# Altium integrated library Samtec PC104 Plus.IntLib: 120 symbols (part 2 of 2)
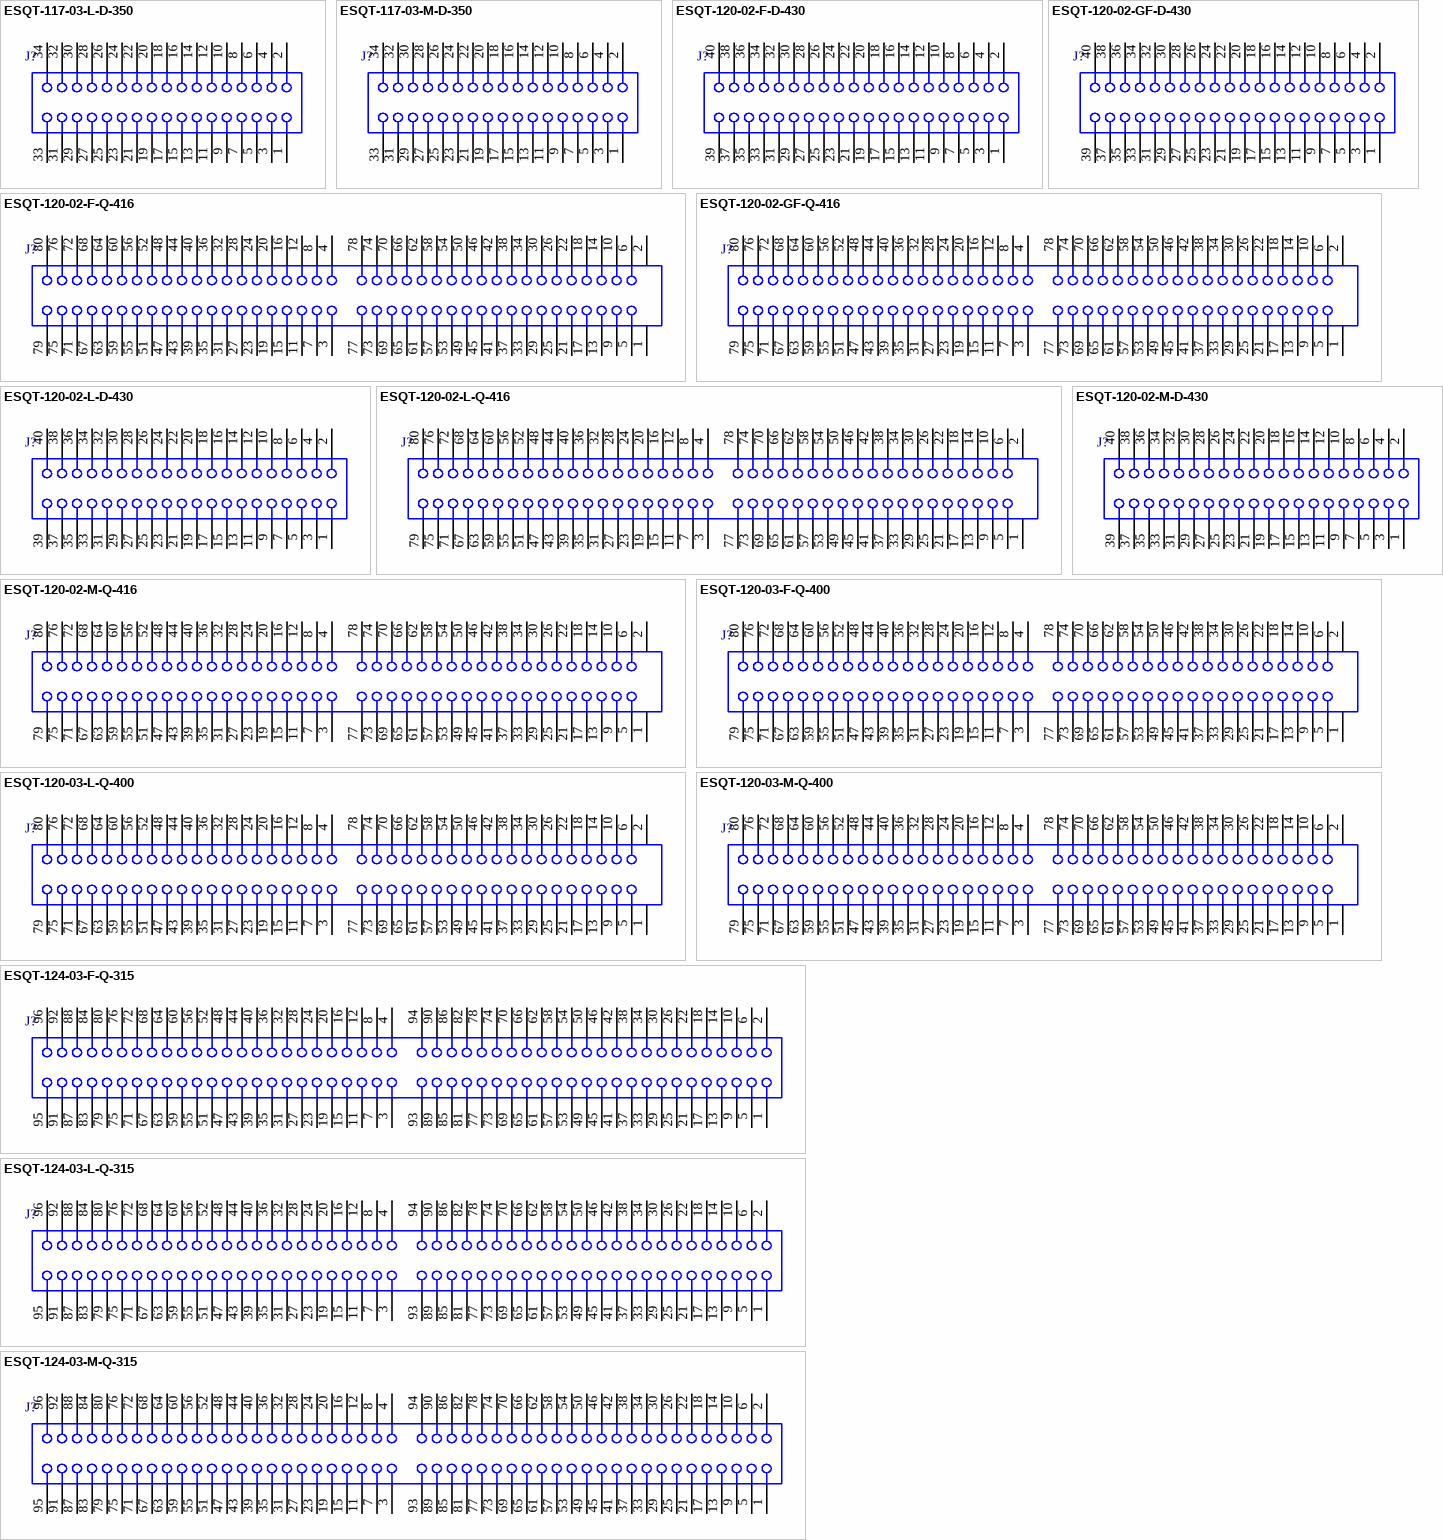
[diagram p5: symbols ESQT-117-03-L-D-350 to ESQT-124-03-M-Q-315]

## ESQT-120-03-F-Q-400
designator J?
PC/104-Plus(TM) Flexible Elevated Socket Strips, Through-hole, Vertical, -55 to 125 degC, 2 mm Pitch, 80-Pin, Female, RoHS; Manufacturer: Samtec; PartNumber: ESQT-120-03-F-Q-400; Pitch: 2 mm; DatasheetVersion: F-214; PackageVersion: BK, 10/1995; PackageReference: ESQT-120-03-X-Q-400; PackageDescription: Elevated SQT ASSM; Orientation: Vertical; RoHS: True; Temperature Range: -55 to 125 degC; Mounting Technology: Through-hole; ComponentLink1Description: Manufacturer URL; ComponentLink1URL: http://www.samtec.com; ComponentLink2Description: Datasheet; ComponentLink2URL: http://www.samtec.com/documents/webfiles/pdf/ESQT_TH.PDF; ComponentLink3Description: Package Specification; ComponentLink3URL: http://www.samtec.com/documents/webfiles/cpdf/ESQT-1XX-XX-XX-X-XXX-XXX-XX-MKT.pdf
footprint SMTC-ESQT-120-03-X-Q-400 (Flexible Elevated Socket, 4x20 Pins, Vertical, 2mm Pitch, Female)
pins: 1, 2, 3, 4, 5, 6, 7, 8, 9, 10, 11, 12, 13, 14, 15, 16, 17, 18, 19, 20, 21, 22, 23, 24, 25, 26, 27, 28, 29, 30, 31, 32, 33, 34, 35, 36, 37, 38, 39, 40, 41, 42, 43, 44, 45, 46, 47, 48, 49, 50, 51, 52, 53, 54, 55, 56, 57, 58, 59, 60, 61, 62, 63, 64, 65, 66, 67, 68, 69, 70, 71, 72, 73, 74, 75, 76, 77, 78, 79, 80

## ESQT-120-03-L-Q-400
designator J?
PC/104-Plus(TM) Flexible Elevated Socket Strips, Through-hole, Vertical, -55 to 125 degC, 2 mm Pitch, 80-Pin, Female, RoHS; Manufacturer: Samtec; PartNumber: ESQT-120-03-L-Q-400; Pitch: 2 mm; DatasheetVersion: F-214; PackageVersion: BK, 10/1995; PackageReference: ESQT-120-03-X-Q-400; PackageDescription: Elevated SQT ASSM; Orientation: Vertical; RoHS: True; Temperature Range: -55 to 125 degC; Mounting Technology: Through-hole; ComponentLink1Description: Manufacturer URL; ComponentLink1URL: http://www.samtec.com; ComponentLink2Description: Datasheet; ComponentLink2URL: http://www.samtec.com/documents/webfiles/pdf/ESQT_TH.PDF; ComponentLink3Description: Package Specification; ComponentLink3URL: http://www.samtec.com/documents/webfiles/cpdf/ESQT-1XX-XX-XX-X-XXX-XXX-XX-MKT.pdf
footprint SMTC-ESQT-120-03-X-Q-400 (Flexible Elevated Socket, 4x20 Pins, Vertical, 2mm Pitch, Female)
pins: 1, 2, 3, 4, 5, 6, 7, 8, 9, 10, 11, 12, 13, 14, 15, 16, 17, 18, 19, 20, 21, 22, 23, 24, 25, 26, 27, 28, 29, 30, 31, 32, 33, 34, 35, 36, 37, 38, 39, 40, 41, 42, 43, 44, 45, 46, 47, 48, 49, 50, 51, 52, 53, 54, 55, 56, 57, 58, 59, 60, 61, 62, 63, 64, 65, 66, 67, 68, 69, 70, 71, 72, 73, 74, 75, 76, 77, 78, 79, 80

## ESQT-120-03-M-Q-400
designator J?
PC/104-Plus(TM) Flexible Elevated Socket Strips, Through-hole, Vertical, -55 to 125 degC, 2 mm Pitch, 80-Pin, Female, RoHS; Manufacturer: Samtec; PartNumber: ESQT-120-03-M-Q-400; Pitch: 2 mm; DatasheetVersion: F-214; PackageVersion: BK, 10/1995; PackageReference: ESQT-120-03-X-Q-400; PackageDescription: Elevated SQT ASSM; Orientation: Vertical; RoHS: True; Temperature Range: -55 to 125 degC; Mounting Technology: Through-hole; ComponentLink1Description: Manufacturer URL; ComponentLink1URL: http://www.samtec.com; ComponentLink2Description: Datasheet; ComponentLink2URL: http://www.samtec.com/documents/webfiles/pdf/ESQT_TH.PDF; ComponentLink3Description: Package Specification; ComponentLink3URL: http://www.samtec.com/documents/webfiles/cpdf/ESQT-1XX-XX-XX-X-XXX-XXX-XX-MKT.pdf
footprint SMTC-ESQT-120-03-X-Q-400 (Flexible Elevated Socket, 4x20 Pins, Vertical, 2mm Pitch, Female)
pins: 1, 2, 3, 4, 5, 6, 7, 8, 9, 10, 11, 12, 13, 14, 15, 16, 17, 18, 19, 20, 21, 22, 23, 24, 25, 26, 27, 28, 29, 30, 31, 32, 33, 34, 35, 36, 37, 38, 39, 40, 41, 42, 43, 44, 45, 46, 47, 48, 49, 50, 51, 52, 53, 54, 55, 56, 57, 58, 59, 60, 61, 62, 63, 64, 65, 66, 67, 68, 69, 70, 71, 72, 73, 74, 75, 76, 77, 78, 79, 80

## ESQT-124-03-F-Q-315
designator J?
PC/104-Plus(TM) Flexible Elevated Socket Strips, Through-hole, Vertical, -55 to 125 degC, 2 mm Pitch, 96-Pin, Female, RoHS; Manufacturer: Samtec; PartNumber: ESQT-124-03-F-Q-315; Pitch: 2 mm; DatasheetVersion: F-214; PackageVersion: BK, 10/1995; PackageReference: ESQT-124-03-X-Q-315; PackageDescription: Elevated SQT ASSM; Orientation: Vertical; RoHS: True; Temperature Range: -55 to 125 degC; Mounting Technology: Through-hole; ComponentLink1Description: Manufacturer URL; ComponentLink1URL: http://www.samtec.com; ComponentLink2Description: Datasheet; ComponentLink2URL: http://www.samtec.com/documents/webfiles/pdf/ESQT_TH.PDF; ComponentLink3Description: Package Specification; ComponentLink3URL: http://www.samtec.com/documents/webfiles/cpdf/ESQT-1XX-XX-XX-X-XXX-XXX-XX-MKT.pdf
footprint SMTC-ESQT-124-03-X-Q-315 (Flexible Elevated Socket, 4x24 Pins, Vertical, 2mm Pitch, Female)
pins: 1, 2, 3, 4, 5, 6, 7, 8, 9, 10, 11, 12, 13, 14, 15, 16, 17, 18, 19, 20, 21, 22, 23, 24, 25, 26, 27, 28, 29, 30, 31, 32, 33, 34, 35, 36, 37, 38, 39, 40, 41, 42, 43, 44, 45, 46, 47, 48, 49, 50, 51, 52, 53, 54, 55, 56, 57, 58, 59, 60, 61, 62, 63, 64, 65, 66, 67, 68, 69, 70, 71, 72, 73, 74, 75, 76, 77, 78, 79, 80, 81, 82, 83, 84, 85, 86, 87, 88, 89, 90, 91, 92, 93, 94, 95, 96

## ESQT-124-03-L-Q-315
designator J?
PC/104-Plus(TM) Flexible Elevated Socket Strips, Through-hole, Vertical, -55 to 125 degC, 2 mm Pitch, 96-Pin, Female, RoHS; Manufacturer: Samtec; PartNumber: ESQT-124-03-L-Q-315; Pitch: 2 mm; DatasheetVersion: F-214; PackageVersion: BK, 10/1995; PackageReference: ESQT-124-03-X-Q-315; PackageDescription: Elevated SQT ASSM; Orientation: Vertical; RoHS: True; Temperature Range: -55 to 125 degC; Mounting Technology: Through-hole; ComponentLink1Description: Manufacturer URL; ComponentLink1URL: http://www.samtec.com; ComponentLink2Description: Datasheet; ComponentLink2URL: http://www.samtec.com/documents/webfiles/pdf/ESQT_TH.PDF; ComponentLink3Description: Package Specification; ComponentLink3URL: http://www.samtec.com/documents/webfiles/cpdf/ESQT-1XX-XX-XX-X-XXX-XXX-XX-MKT.pdf
footprint SMTC-ESQT-124-03-X-Q-315 (Flexible Elevated Socket, 4x24 Pins, Vertical, 2mm Pitch, Female)
pins: 1, 2, 3, 4, 5, 6, 7, 8, 9, 10, 11, 12, 13, 14, 15, 16, 17, 18, 19, 20, 21, 22, 23, 24, 25, 26, 27, 28, 29, 30, 31, 32, 33, 34, 35, 36, 37, 38, 39, 40, 41, 42, 43, 44, 45, 46, 47, 48, 49, 50, 51, 52, 53, 54, 55, 56, 57, 58, 59, 60, 61, 62, 63, 64, 65, 66, 67, 68, 69, 70, 71, 72, 73, 74, 75, 76, 77, 78, 79, 80, 81, 82, 83, 84, 85, 86, 87, 88, 89, 90, 91, 92, 93, 94, 95, 96

## ESQT-124-03-M-Q-315
designator J?
PC/104-Plus(TM) Flexible Elevated Socket Strips, Through-hole, Vertical, -55 to 125 degC, 2 mm Pitch, 96-Pin, Female, RoHS; Manufacturer: Samtec; PartNumber: ESQT-124-03-M-Q-315; Pitch: 2 mm; DatasheetVersion: F-214; PackageVersion: BK, 10/1995; PackageReference: ESQT-124-03-X-Q-315; PackageDescription: Elevated SQT ASSM; Orientation: Vertical; RoHS: True; Temperature Range: -55 to 125 degC; Mounting Technology: Through-hole; ComponentLink1Description: Manufacturer URL; ComponentLink1URL: http://www.samtec.com; ComponentLink2Description: Datasheet; ComponentLink2URL: http://www.samtec.com/documents/webfiles/pdf/ESQT_TH.PDF; ComponentLink3Description: Package Specification; ComponentLink3URL: http://www.samtec.com/documents/webfiles/cpdf/ESQT-1XX-XX-XX-X-XXX-XXX-XX-MKT.pdf
footprint SMTC-ESQT-124-03-X-Q-315 (Flexible Elevated Socket, 4x24 Pins, Vertical, 2mm Pitch, Female)
pins: 1, 2, 3, 4, 5, 6, 7, 8, 9, 10, 11, 12, 13, 14, 15, 16, 17, 18, 19, 20, 21, 22, 23, 24, 25, 26, 27, 28, 29, 30, 31, 32, 33, 34, 35, 36, 37, 38, 39, 40, 41, 42, 43, 44, 45, 46, 47, 48, 49, 50, 51, 52, 53, 54, 55, 56, 57, 58, 59, 60, 61, 62, 63, 64, 65, 66, 67, 68, 69, 70, 71, 72, 73, 74, 75, 76, 77, 78, 79, 80, 81, 82, 83, 84, 85, 86, 87, 88, 89, 90, 91, 92, 93, 94, 95, 96

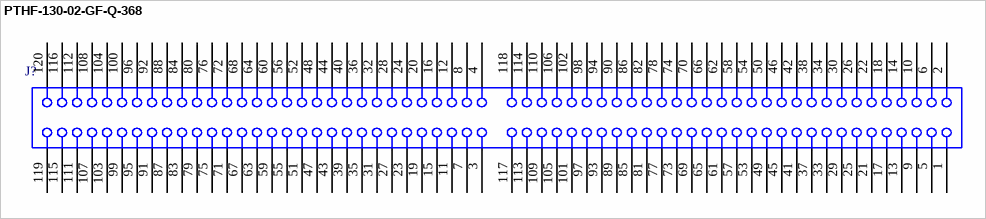
[diagram p4: symbol PTHF-130-02-GF-Q-368]

## PTHF-130-02-GF-Q-368
designator J?
PC/104-Plus(TM) Self-Nesting Sockets, Through-hole, Vertical, -55 to 125 degC, 2 mm Pitch, 120-Pin, Female, RoHS; Manufacturer: Samtec; PartNumber: PTHF-130-02-GF-Q-368; Pitch: 2 mm; DatasheetVersion: F-214; PackageVersion: S, 12/2000; PackageReference: PTHF-130-02-X-Q-368; PackageDescription: 2 mm PC104+ Compliant Pin Socket; Supplier 1: Farnell; Supplier Part Number 1: 1753931; Supplier 2: Newark; Supplier Part Number 2: 33R0906; Orientation: Vertical; RoHS: True; Temperature Range: -55 to 125 degC; Mounting Technology: Through-hole; ComponentLink1Description: Manufacturer URL; ComponentLink1URL: http://www.samtec.com; ComponentLink2Description: Datasheet; ComponentLink2URL: http://www.samtec.com/documents/webfiles/pdf/pthf.pdf; ComponentLink3Description: Package Specification; ComponentLink3URL: http://www.samtec.com/documents/webfiles/cpdf/PTHF-1XX-XX-XX-Q-368-MKT.pdf
footprint SMTC-PTHF-130-02-X-Q-368 (Self-Nesting Sockets, 4x30 Pins, Vertical, 2mm Pitch, Female)
pins: 1, 2, 3, 4, 5, 6, 7, 8, 9, 10, 11, 12, 13, 14, 15, 16, 17, 18, 19, 20, 21, 22, 23, 24, 25, 26, 27, 28, 29, 30, 31, 32, 33, 34, 35, 36, 37, 38, 39, 40, 41, 42, 43, 44, 45, 46, 47, 48, 49, 50, 51, 52, 53, 54, 55, 56, 57, 58, 59, 60, 61, 62, 63, 64, 65, 66, 67, 68, 69, 70, 71, 72, 73, 74, 75, 76, 77, 78, 79, 80, 81, 82, 83, 84, 85, 86, 87, 88, 89, 90, 91, 92, 93, 94, 95, 96, 97, 98, 99, 100, 101, 102, 103, 104, 105, 106, 107, 108, 109, 110, 111, 112, 113, 114, 115, 116, 117, 118, 119, 120